# Altium schematic symbol library jlcpcb_2025_04_inductors_extended_0603.schlib: 1269 symbols (part 3 of 7) (continued)
## LQG18HH82NJ00D
designator L?  Inductance: 82nH
Inductor, 82nH, ±5%, 850mΩ, 300mA, SMD 0603; Manufacturer: Murata Electronics; Manufacturer Part Number: LQG18HH82NJ00D; Self-Resonant Frequency: 700MHz; Q Factor: 12@100MHz; Package Size: 0603; JLCPCB Basic Part: No; JLCPCB Part Number: C528976; Supplier 1: LCSC; Category: Inductors; Supplier Part Number 1: C528976; Tolerance: ±5%; Rated Current: 300mA; DC Resistance: 850mΩ; RoHS: Yes; ComponentLink1Description: Datasheet; ComponentLink1URL: https://wmsc.lcsc.com/wmsc/upload/file/pdf/v2/lcsc/2304140030_Murata-Electronics-LQG18HH82NJ00D_C528976.pdf; ComponentLink2Description: JLCPCB Part URL; ComponentLink2URL: https://jlcpcb.com/partdetail/C528976; ComponentLink3Description: LCSC Part URL; ComponentLink3URL: https://lcsc.com/product-detail/Inductors-SMD_Murata-Electronics-Murata-Electronics-LQG18HH82NJ00D_C528976.html
footprint IND-0603 (0603 (1608M) Inductor)
pins: 1, 2

## LQG18HHR15J00D
designator L?  Inductance: 150nH
Inductor, 150nH, ±5%, 1.2Ω, 300mA, SMD 0603; Manufacturer: Murata Electronics; Manufacturer Part Number: LQG18HHR15J00D; Self-Resonant Frequency: 550MHz; Q Factor: 14@250MHz; Package Size: 0603; JLCPCB Basic Part: No; JLCPCB Part Number: C471399; Supplier 1: LCSC; Category: Inductors; Supplier Part Number 1: C471399; Tolerance: ±5%; Rated Current: 300mA; DC Resistance: 1.2Ω; RoHS: Yes; ComponentLink1Description: Datasheet; ComponentLink1URL: https://wmsc.lcsc.com/wmsc/upload/file/pdf/v2/lcsc/2304140030_Murata-Electronics-LQG18HHR15J00D_C471399.pdf; ComponentLink2Description: JLCPCB Part URL; ComponentLink2URL: https://jlcpcb.com/partdetail/C471399; ComponentLink3Description: LCSC Part URL; ComponentLink3URL: https://lcsc.com/product-detail/Inductors-SMD_Murata-Electronics-Murata-Electronics-LQG18HHR15J00D_C471399.html
footprint IND-0603 (0603 (1608M) Inductor)
pins: 1, 2

## LQG18HHR18J00D
designator L?  Inductance: 180nH
Inductor, 180nH, ±5%, 1.3Ω, 300mA, SMD 0603; Manufacturer: Murata Electronics; Manufacturer Part Number: LQG18HHR18J00D; Self-Resonant Frequency: 500MHz; Q Factor: 14@100MHz; Package Size: 0603; JLCPCB Basic Part: No; JLCPCB Part Number: C1852012; Supplier 1: LCSC; Category: Inductors; Supplier Part Number 1: C1852012; Tolerance: ±5%; Rated Current: 300mA; DC Resistance: 1.3Ω; RoHS: Yes; ComponentLink1Description: Datasheet; ComponentLink1URL: https://wmsc.lcsc.com/wmsc/upload/file/pdf/v2/lcsc/2304140030_Murata-Electronics-LQG18HHR18J00D_C1852012.pdf; ComponentLink2Description: JLCPCB Part URL; ComponentLink2URL: https://jlcpcb.com/partdetail/C1852012; ComponentLink3Description: LCSC Part URL; ComponentLink3URL: https://lcsc.com/product-detail/Inductors-SMD_Murata-Electronics-Murata-Electronics-LQG18HHR18J00D_C1852012.html
footprint IND-0603 (0603 (1608M) Inductor)
pins: 1, 2

## LQG18HHR22J00D
designator L?  Inductance: 220nH
Inductor, 220nH, ±5%, 1.5Ω, 300mA, SMD 0603; Manufacturer: Murata Electronics; Manufacturer Part Number: LQG18HHR22J00D; Self-Resonant Frequency: 450MHz; Q Factor: 14@100MHz; Package Size: 0603; JLCPCB Basic Part: No; JLCPCB Part Number: C882497; Supplier 1: LCSC; Category: Inductors; Supplier Part Number 1: C882497; Tolerance: ±5%; Rated Current: 300mA; DC Resistance: 1.5Ω; RoHS: Yes; ComponentLink1Description: Datasheet; ComponentLink1URL: https://wmsc.lcsc.com/wmsc/upload/file/pdf/v2/lcsc/2201242130_Murata-Electronics-LQG18HHR22J00D_C882497.pdf; ComponentLink2Description: JLCPCB Part URL; ComponentLink2URL: https://jlcpcb.com/partdetail/C882497; ComponentLink3Description: LCSC Part URL; ComponentLink3URL: https://lcsc.com/product-detail/Inductors-SMD_Murata-Electronics-Murata-Electronics-LQG18HHR22J00D_C882497.html
footprint IND-0603 (0603 (1608M) Inductor)
pins: 1, 2

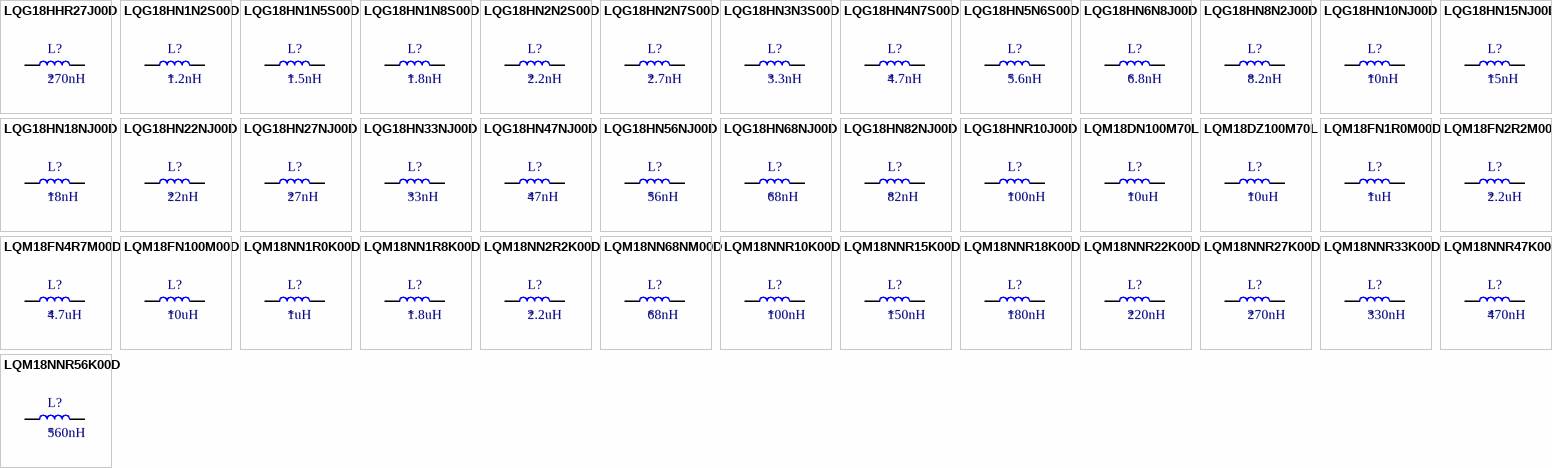
[diagram p12: symbols LQG18HHR27J00D to LQM18NNR56K00D]

## LQG18HHR27J00D
designator L?  Inductance: 270nH
Inductor, 270nH, ±5%, 1.9Ω, 200mA, SMD 0603; Manufacturer: Murata Electronics; Manufacturer Part Number: LQG18HHR27J00D; Self-Resonant Frequency: 100MHz; Q Factor: 14@100MHz; Package Size: 0603; JLCPCB Basic Part: No; JLCPCB Part Number: C471400; Supplier 1: LCSC; Category: Inductors; Supplier Part Number 1: C471400; Tolerance: ±5%; Rated Current: 200mA; DC Resistance: 1.9Ω; RoHS: Yes; ComponentLink1Description: Datasheet; ComponentLink1URL: https://wmsc.lcsc.com/wmsc/upload/file/pdf/v2/lcsc/2304140030_Murata-Electronics-LQG18HHR27J00D_C471400.pdf; ComponentLink2Description: JLCPCB Part URL; ComponentLink2URL: https://jlcpcb.com/partdetail/C471400; ComponentLink3Description: LCSC Part URL; ComponentLink3URL: https://lcsc.com/product-detail/Inductors-SMD_Murata-Electronics-Murata-Electronics-LQG18HHR27J00D_C471400.html
footprint IND-0603 (0603 (1608M) Inductor)
pins: 1, 2

## LQG18HN1N2S00D
designator L?  Inductance: 1.2nH
Inductor, 1.2nH, 100mΩ, 1.1A, SMD 0603; Manufacturer: Murata Electronics; Manufacturer Part Number: LQG18HN1N2S00D; Self-Resonant Frequency: 6GHz; Q Factor: 12@100MHz; Package Size: 0603; JLCPCB Basic Part: No; JLCPCB Part Number: C882496; Supplier 1: LCSC; Category: Inductors; Supplier Part Number 1: C882496; Rated Current: 1.1A; DC Resistance: 100mΩ; RoHS: Yes; ComponentLink1Description: Datasheet; ComponentLink1URL: https://wmsc.lcsc.com/wmsc/upload/file/pdf/v2/lcsc/2212191030_Murata-Electronics-LQG18HN1N2S00D_C882496.pdf; ComponentLink2Description: JLCPCB Part URL; ComponentLink2URL: https://jlcpcb.com/partdetail/C882496; ComponentLink3Description: LCSC Part URL; ComponentLink3URL: https://lcsc.com/product-detail/Inductors-SMD_Murata-Electronics-Murata-Electronics-LQG18HN1N2S00D_C882496.html
footprint IND-0603 (0603 (1608M) Inductor)
pins: 1, 2

## LQG18HN1N5S00D
designator L?  Inductance: 1.5nH
Inductor, 1.5nH, 100mΩ, 1.1A, SMD 0603; Manufacturer: Murata Electronics; Manufacturer Part Number: LQG18HN1N5S00D; Self-Resonant Frequency: 6GHz; Q Factor: 12@100MHz; Package Size: 0603; JLCPCB Basic Part: No; JLCPCB Part Number: C882495; Supplier 1: LCSC; Category: Inductors; Supplier Part Number 1: C882495; Rated Current: 1.1A; DC Resistance: 100mΩ; RoHS: Yes; ComponentLink1Description: Datasheet; ComponentLink1URL: https://wmsc.lcsc.com/wmsc/upload/file/pdf/v2/lcsc/2201242130_Murata-Electronics-LQG18HN1N5S00D_C882495.pdf; ComponentLink2Description: JLCPCB Part URL; ComponentLink2URL: https://jlcpcb.com/partdetail/C882495; ComponentLink3Description: LCSC Part URL; ComponentLink3URL: https://lcsc.com/product-detail/Inductors-SMD_Murata-Electronics-Murata-Electronics-LQG18HN1N5S00D_C882495.html
footprint IND-0603 (0603 (1608M) Inductor)
pins: 1, 2

## LQG18HN1N8S00D
designator L?  Inductance: 1.8nH
Inductor, 1.8nH, 100mΩ, 1.1A, SMD 0603; Manufacturer: Murata Electronics; Manufacturer Part Number: LQG18HN1N8S00D; Self-Resonant Frequency: 6GHz; Q Factor: 12@100MHz; Package Size: 0603; JLCPCB Basic Part: No; JLCPCB Part Number: C341764; Supplier 1: LCSC; Category: Inductors; Supplier Part Number 1: C341764; Rated Current: 1.1A; DC Resistance: 100mΩ; RoHS: Yes; ComponentLink1Description: Datasheet; ComponentLink1URL: https://wmsc.lcsc.com/wmsc/upload/file/pdf/v2/lcsc/2105241210_Murata-Electronics-LQG18HN1N8S00D_C341764.pdf; ComponentLink2Description: JLCPCB Part URL; ComponentLink2URL: https://jlcpcb.com/partdetail/C341764; ComponentLink3Description: LCSC Part URL; ComponentLink3URL: https://lcsc.com/product-detail/Inductors-SMD_Murata-Electronics-Murata-Electronics-LQG18HN1N8S00D_C341764.html
footprint IND-0603 (0603 (1608M) Inductor)
pins: 1, 2

## LQG18HN2N2S00D
designator L?  Inductance: 2.2nH
Inductor, 2.2nH, 100mΩ, 1.1A, SMD 0603; Manufacturer: Murata Electronics; Manufacturer Part Number: LQG18HN2N2S00D; Self-Resonant Frequency: 6GHz; Q Factor: 12@250MHz; Package Size: 0603; JLCPCB Basic Part: No; JLCPCB Part Number: C113061; Supplier 1: LCSC; Category: Inductors; Supplier Part Number 1: C113061; Rated Current: 1.1A; DC Resistance: 100mΩ; RoHS: Yes; ComponentLink1Description: Datasheet; ComponentLink1URL: https://wmsc.lcsc.com/wmsc/upload/file/pdf/v2/lcsc/1810311140_Murata-Electronics-LQG18HN2N2S00D_C113061.pdf; ComponentLink2Description: JLCPCB Part URL; ComponentLink2URL: https://jlcpcb.com/partdetail/C113061; ComponentLink3Description: LCSC Part URL; ComponentLink3URL: https://lcsc.com/product-detail/Inductors-SMD_Murata-Electronics-Murata-Electronics-LQG18HN2N2S00D_C113061.html
footprint IND-0603 (0603 (1608M) Inductor)
pins: 1, 2

## LQG18HN2N7S00D
designator L?  Inductance: 2.7nH
Inductor, 2.7nH, 120mΩ, 500mA, SMD 0603; Manufacturer: Murata Electronics; Manufacturer Part Number: LQG18HN2N7S00D; Self-Resonant Frequency: 6GHz; Q Factor: 12@100MHz; Package Size: 0603; JLCPCB Basic Part: No; JLCPCB Part Number: C162551; Supplier 1: LCSC; Category: Inductors; Supplier Part Number 1: C162551; Rated Current: 500mA; DC Resistance: 120mΩ; RoHS: Yes; ComponentLink1Description: Datasheet; ComponentLink1URL: https://wmsc.lcsc.com/wmsc/upload/file/pdf/v2/lcsc/2304140030_Murata-Electronics-LQG18HN2N7S00D_C162551.pdf; ComponentLink2Description: JLCPCB Part URL; ComponentLink2URL: https://jlcpcb.com/partdetail/C162551; ComponentLink3Description: LCSC Part URL; ComponentLink3URL: https://lcsc.com/product-detail/Inductors-SMD_Murata-Electronics-Murata-Electronics-LQG18HN2N7S00D_C162551.html
footprint IND-0603 (0603 (1608M) Inductor)
pins: 1, 2

## LQG18HN3N3S00D
designator L?  Inductance: 3.3nH
Inductor, 3.3nH, 120mΩ, 1A, SMD 0603; Manufacturer: Murata Electronics; Manufacturer Part Number: LQG18HN3N3S00D; Self-Resonant Frequency: 6GHz; Q Factor: 12@100MHz; Package Size: 0603; JLCPCB Basic Part: No; JLCPCB Part Number: C162552; Supplier 1: LCSC; Category: Inductors; Supplier Part Number 1: C162552; Rated Current: 1A; DC Resistance: 120mΩ; RoHS: Yes; ComponentLink1Description: Datasheet; ComponentLink1URL: https://wmsc.lcsc.com/wmsc/upload/file/pdf/v2/lcsc/2304140030_Murata-Electronics-LQG18HN3N3S00D_C162552.pdf; ComponentLink2Description: JLCPCB Part URL; ComponentLink2URL: https://jlcpcb.com/partdetail/C162552; ComponentLink3Description: LCSC Part URL; ComponentLink3URL: https://lcsc.com/product-detail/Inductors-SMD_Murata-Electronics-Murata-Electronics-LQG18HN3N3S00D_C162552.html
footprint IND-0603 (0603 (1608M) Inductor)
pins: 1, 2

## LQG18HN4N7S00D
designator L?  Inductance: 4.7nH
Inductor, 4.7nH, 150mΩ, 900mA, SMD 0603; Manufacturer: Murata Electronics; Manufacturer Part Number: LQG18HN4N7S00D; Self-Resonant Frequency: 6GHz; Q Factor: 12@100MHz; Package Size: 0603; JLCPCB Basic Part: No; JLCPCB Part Number: C882494; Supplier 1: LCSC; Category: Inductors; Supplier Part Number 1: C882494; Rated Current: 900mA; DC Resistance: 150mΩ; RoHS: Yes; ComponentLink1Description: Datasheet; ComponentLink1URL: https://wmsc.lcsc.com/wmsc/upload/file/pdf/v2/lcsc/2201242130_Murata-Electronics-LQG18HN4N7S00D_C882494.pdf; ComponentLink2Description: JLCPCB Part URL; ComponentLink2URL: https://jlcpcb.com/partdetail/C882494; ComponentLink3Description: LCSC Part URL; ComponentLink3URL: https://lcsc.com/product-detail/Inductors-SMD_Murata-Electronics-Murata-Electronics-LQG18HN4N7S00D_C882494.html
footprint IND-0603 (0603 (1608M) Inductor)
pins: 1, 2

## LQG18HN5N6S00D
designator L?  Inductance: 5.6nH
Inductor, 5.6nH, 200mΩ, 800mA, SMD 0603; Manufacturer: Murata Electronics; Manufacturer Part Number: LQG18HN5N6S00D; Self-Resonant Frequency: 5GHz; Q Factor: 12@100MHz; Package Size: 0603; JLCPCB Basic Part: No; JLCPCB Part Number: C441735; Supplier 1: LCSC; Category: Inductors; Supplier Part Number 1: C441735; Rated Current: 800mA; DC Resistance: 200mΩ; RoHS: Yes; ComponentLink1Description: Datasheet; ComponentLink1URL: https://wmsc.lcsc.com/wmsc/upload/file/pdf/v2/lcsc/2001062032_Murata-Electronics-LQG18HN5N6S00D_C441735.pdf; ComponentLink2Description: JLCPCB Part URL; ComponentLink2URL: https://jlcpcb.com/partdetail/C441735; ComponentLink3Description: LCSC Part URL; ComponentLink3URL: https://lcsc.com/product-detail/Inductors-SMD_Murata-Electronics-Murata-Electronics-LQG18HN5N6S00D_C441735.html
footprint IND-0603 (0603 (1608M) Inductor)
pins: 1, 2

## LQG18HN6N8J00D
designator L?  Inductance: 6.8nH
Inductor, 6.8nH, ±5%, 200mΩ, 800mA, SMD 0603; Manufacturer: Murata Electronics; Manufacturer Part Number: LQG18HN6N8J00D; Self-Resonant Frequency: 5GHz; Q Factor: 12@100MHz; Package Size: 0603; JLCPCB Basic Part: No; JLCPCB Part Number: C882493; Supplier 1: LCSC; Category: Inductors; Supplier Part Number 1: C882493; Tolerance: ±5%; Rated Current: 800mA; DC Resistance: 200mΩ; RoHS: Yes; ComponentLink1Description: Datasheet; ComponentLink1URL: https://wmsc.lcsc.com/wmsc/upload/file/pdf/v2/lcsc/2201242130_Murata-Electronics-LQG18HN6N8J00D_C882493.pdf; ComponentLink2Description: JLCPCB Part URL; ComponentLink2URL: https://jlcpcb.com/partdetail/C882493; ComponentLink3Description: LCSC Part URL; ComponentLink3URL: https://lcsc.com/product-detail/Inductors-SMD_Murata-Electronics-Murata-Electronics-LQG18HN6N8J00D_C882493.html
footprint IND-0603 (0603 (1608M) Inductor)
pins: 1, 2

## LQG18HN8N2J00D
designator L?  Inductance: 8.2nH
Inductor, 8.2nH, ±5%, 200mΩ, 400mA, SMD 0603; Manufacturer: Murata Electronics; Manufacturer Part Number: LQG18HN8N2J00D; Self-Resonant Frequency: 4GHz; Q Factor: 12@100MHz; Package Size: 0603; JLCPCB Basic Part: No; JLCPCB Part Number: C98009; Supplier 1: LCSC; Category: Inductors; Supplier Part Number 1: C98009; Tolerance: ±5%; Rated Current: 400mA; DC Resistance: 200mΩ; RoHS: Yes; ComponentLink1Description: Datasheet; ComponentLink1URL: https://wmsc.lcsc.com/wmsc/upload/file/pdf/v2/lcsc/1811031411_Murata-Electronics-LQG18HN8N2J00D_C98009.pdf; ComponentLink2Description: JLCPCB Part URL; ComponentLink2URL: https://jlcpcb.com/partdetail/C98009; ComponentLink3Description: LCSC Part URL; ComponentLink3URL: https://lcsc.com/product-detail/Inductors-SMD_Murata-Electronics-Murata-Electronics-LQG18HN8N2J00D_C98009.html
footprint IND-0603 (0603 (1608M) Inductor)
pins: 1, 2

## LQG18HN10NJ00D
designator L?  Inductance: 10nH
Inductor, 10nH, ±5%, 300mΩ, 400mA, SMD 0603; Manufacturer: Murata Electronics; Manufacturer Part Number: LQG18HN10NJ00D; Self-Resonant Frequency: 3.5GHz; Q Factor: 12@100MHz; Package Size: 0603; JLCPCB Basic Part: No; JLCPCB Part Number: C98005; Supplier 1: LCSC; Category: Inductors; Supplier Part Number 1: C98005; Tolerance: ±5%; Rated Current: 400mA; DC Resistance: 300mΩ; RoHS: Yes; ComponentLink1Description: Datasheet; ComponentLink1URL: https://wmsc.lcsc.com/wmsc/upload/file/pdf/v2/lcsc/1810311113_Murata-Electronics-LQG18HN10NJ00D_C98005.pdf; ComponentLink2Description: JLCPCB Part URL; ComponentLink2URL: https://jlcpcb.com/partdetail/C98005; ComponentLink3Description: LCSC Part URL; ComponentLink3URL: https://lcsc.com/product-detail/Inductors-SMD_Murata-Electronics-Murata-Electronics-LQG18HN10NJ00D_C98005.html
footprint IND-0603 (0603 (1608M) Inductor)
pins: 1, 2

## LQG18HN15NJ00D
designator L?  Inductance: 15nH
Inductor, 15nH, ±5%, 350mΩ, 350mA, SMD 0603; Manufacturer: Murata Electronics; Manufacturer Part Number: LQG18HN15NJ00D; Self-Resonant Frequency: 2.8GHz; Q Factor: 12@100MHz; Package Size: 0603; JLCPCB Basic Part: No; JLCPCB Part Number: C98006; Supplier 1: LCSC; Category: Inductors; Supplier Part Number 1: C98006; Tolerance: ±5%; Rated Current: 350mA; DC Resistance: 350mΩ; RoHS: Yes; ComponentLink1Description: Datasheet; ComponentLink1URL: https://wmsc.lcsc.com/wmsc/upload/file/pdf/v2/lcsc/1811132212_Murata-Electronics-LQG18HN15NJ00D_C98006.pdf; ComponentLink2Description: JLCPCB Part URL; ComponentLink2URL: https://jlcpcb.com/partdetail/C98006; ComponentLink3Description: LCSC Part URL; ComponentLink3URL: https://lcsc.com/product-detail/Inductors-SMD_Murata-Electronics-Murata-Electronics-LQG18HN15NJ00D_C98006.html
footprint IND-0603 (0603 (1608M) Inductor)
pins: 1, 2

## LQG18HN18NJ00D
designator L?  Inductance: 18nH
Inductor, 18nH, ±5%, 370mΩ, 600mA, SMD 0603; Manufacturer: Murata Electronics; Manufacturer Part Number: LQG18HN18NJ00D; Self-Resonant Frequency: 2.6GHz; Q Factor: 12@250MHz; Package Size: 0603; JLCPCB Basic Part: No; JLCPCB Part Number: C98007; Supplier 1: LCSC; Category: Inductors; Supplier Part Number 1: C98007; Tolerance: ±5%; Rated Current: 600mA; DC Resistance: 370mΩ; RoHS: Yes; ComponentLink1Description: Datasheet; ComponentLink1URL: https://wmsc.lcsc.com/wmsc/upload/file/pdf/v2/lcsc/1810311135_Murata-Electronics-LQG18HN18NJ00D_C98007.pdf; ComponentLink2Description: JLCPCB Part URL; ComponentLink2URL: https://jlcpcb.com/partdetail/C98007; ComponentLink3Description: LCSC Part URL; ComponentLink3URL: https://lcsc.com/product-detail/Inductors-SMD_Murata-Electronics-Murata-Electronics-LQG18HN18NJ00D_C98007.html
footprint IND-0603 (0603 (1608M) Inductor)
pins: 1, 2

## LQG18HN22NJ00D
designator L?  Inductance: 22nH
Inductor, 22nH, ±5%, 500mΩ, 500mA, SMD 0603; Manufacturer: Murata Electronics; Manufacturer Part Number: LQG18HN22NJ00D; Self-Resonant Frequency: 2.3GHz; Q Factor: 12@100MHz; Package Size: 0603; JLCPCB Basic Part: No; JLCPCB Part Number: C71649; Supplier 1: LCSC; Category: Inductors; Supplier Part Number 1: C71649; Tolerance: ±5%; Rated Current: 500mA; DC Resistance: 500mΩ; RoHS: Yes; ComponentLink1Description: Datasheet; ComponentLink1URL: https://wmsc.lcsc.com/wmsc/upload/file/pdf/v2/lcsc/1810311122_Murata-Electronics-LQG18HN22NJ00D_C71649.pdf; ComponentLink2Description: JLCPCB Part URL; ComponentLink2URL: https://jlcpcb.com/partdetail/C71649; ComponentLink3Description: LCSC Part URL; ComponentLink3URL: https://lcsc.com/product-detail/Inductors-SMD_Murata-Electronics-Murata-Electronics-LQG18HN22NJ00D_C71649.html
footprint IND-0603 (0603 (1608M) Inductor)
pins: 1, 2

## LQG18HN27NJ00D
designator L?  Inductance: 27nH
Inductor, 27nH, ±5%, 540mΩ, 500mA, SMD 0603; Manufacturer: Murata Electronics; Manufacturer Part Number: LQG18HN27NJ00D; Self-Resonant Frequency: 2GHz; Q Factor: 12@100MHz; Package Size: 0603; JLCPCB Basic Part: No; JLCPCB Part Number: C162550; Supplier 1: LCSC; Category: Inductors; Supplier Part Number 1: C162550; Tolerance: ±5%; Rated Current: 500mA; DC Resistance: 540mΩ; RoHS: Yes; ComponentLink1Description: Datasheet; ComponentLink1URL: https://wmsc.lcsc.com/wmsc/upload/file/pdf/v2/lcsc/2304140030_Murata-Electronics-LQG18HN27NJ00D_C162550.pdf; ComponentLink2Description: JLCPCB Part URL; ComponentLink2URL: https://jlcpcb.com/partdetail/C162550; ComponentLink3Description: LCSC Part URL; ComponentLink3URL: https://lcsc.com/product-detail/Inductors-SMD_Murata-Electronics-Murata-Electronics-LQG18HN27NJ00D_C162550.html
footprint IND-0603 (0603 (1608M) Inductor)
pins: 1, 2

## LQG18HN33NJ00D
designator L?  Inductance: 33nH
Inductor, 33nH, ±5%, 540mΩ, 500mA, SMD 0603; Manufacturer: Murata Electronics; Manufacturer Part Number: LQG18HN33NJ00D; Self-Resonant Frequency: 1.7GHz; Q Factor: 12@100MHz; Package Size: 0603; JLCPCB Basic Part: No; JLCPCB Part Number: C86068; Supplier 1: LCSC; Category: Inductors; Supplier Part Number 1: C86068; Tolerance: ±5%; Rated Current: 500mA; DC Resistance: 540mΩ; RoHS: Yes; ComponentLink1Description: Datasheet; ComponentLink1URL: https://wmsc.lcsc.com/wmsc/upload/file/pdf/v2/lcsc/2304140030_Murata-Electronics-LQG18HN33NJ00D_C86068.pdf; ComponentLink2Description: JLCPCB Part URL; ComponentLink2URL: https://jlcpcb.com/partdetail/C86068; ComponentLink3Description: LCSC Part URL; ComponentLink3URL: https://lcsc.com/product-detail/Inductors-SMD_Murata-Electronics-Murata-Electronics-LQG18HN33NJ00D_C86068.html
footprint IND-0603 (0603 (1608M) Inductor)
pins: 1, 2

## LQG18HN47NJ00D
designator L?  Inductance: 47nH
Inductor, 47nH, ±5%, 700mΩ, 400mA, SMD 0603; Manufacturer: Murata Electronics; Manufacturer Part Number: LQG18HN47NJ00D; Self-Resonant Frequency: 1.2GHz; Q Factor: 12@100MHz; Package Size: 0603; JLCPCB Basic Part: No; JLCPCB Part Number: C162553; Supplier 1: LCSC; Category: Inductors; Supplier Part Number 1: C162553; Tolerance: ±5%; Rated Current: 400mA; DC Resistance: 700mΩ; RoHS: Yes; ComponentLink1Description: Datasheet; ComponentLink1URL: https://wmsc.lcsc.com/wmsc/upload/file/pdf/v2/lcsc/2304140030_Murata-Electronics-LQG18HN47NJ00D_C162553.pdf; ComponentLink2Description: JLCPCB Part URL; ComponentLink2URL: https://jlcpcb.com/partdetail/C162553; ComponentLink3Description: LCSC Part URL; ComponentLink3URL: https://lcsc.com/product-detail/Inductors-SMD_Murata-Electronics-Murata-Electronics-LQG18HN47NJ00D_C162553.html
footprint IND-0603 (0603 (1608M) Inductor)
pins: 1, 2

## LQG18HN56NJ00D
designator L?  Inductance: 56nH
Inductor, 56nH, ±5%, 750mΩ, 400mA, SMD 0603; Manufacturer: Murata Electronics; Manufacturer Part Number: LQG18HN56NJ00D; Self-Resonant Frequency: 1.1GHz; Q Factor: 12@250MHz; Package Size: 0603; JLCPCB Basic Part: No; JLCPCB Part Number: C162554; Supplier 1: LCSC; Category: Inductors; Supplier Part Number 1: C162554; Tolerance: ±5%; Rated Current: 400mA; DC Resistance: 750mΩ; RoHS: Yes; ComponentLink1Description: Datasheet; ComponentLink1URL: https://wmsc.lcsc.com/wmsc/upload/file/pdf/v2/lcsc/2304140030_Murata-Electronics-LQG18HN56NJ00D_C162554.pdf; ComponentLink2Description: JLCPCB Part URL; ComponentLink2URL: https://jlcpcb.com/partdetail/C162554; ComponentLink3Description: LCSC Part URL; ComponentLink3URL: https://lcsc.com/product-detail/Inductors-SMD_Murata-Electronics-Murata-Electronics-LQG18HN56NJ00D_C162554.html
footprint IND-0603 (0603 (1608M) Inductor)
pins: 1, 2

## LQG18HN68NJ00D
designator L?  Inductance: 68nH
Inductor, 68nH, ±5%, 800mΩ, 400mA, SMD 0603; Manufacturer: Murata Electronics; Manufacturer Part Number: LQG18HN68NJ00D; Self-Resonant Frequency: 1GHz; Q Factor: 12@100MHz; Package Size: 0603; JLCPCB Basic Part: No; JLCPCB Part Number: C162555; Supplier 1: LCSC; Category: Inductors; Supplier Part Number 1: C162555; Tolerance: ±5%; Rated Current: 400mA; DC Resistance: 800mΩ; RoHS: Yes; ComponentLink1Description: Datasheet; ComponentLink1URL: https://wmsc.lcsc.com/wmsc/upload/file/pdf/v2/lcsc/2304140030_Murata-Electronics-LQG18HN68NJ00D_C162555.pdf; ComponentLink2Description: JLCPCB Part URL; ComponentLink2URL: https://jlcpcb.com/partdetail/C162555; ComponentLink3Description: LCSC Part URL; ComponentLink3URL: https://lcsc.com/product-detail/Inductors-SMD_Murata-Electronics-Murata-Electronics-LQG18HN68NJ00D_C162555.html
footprint IND-0603 (0603 (1608M) Inductor)
pins: 1, 2

## LQG18HN82NJ00D
designator L?  Inductance: 82nH
Inductor, 82nH, ±5%, 850mΩ, 350mA, SMD 0603; Manufacturer: Murata Electronics; Manufacturer Part Number: LQG18HN82NJ00D; Self-Resonant Frequency: 900MHz; Q Factor: 12@100MHz; Package Size: 0603; JLCPCB Basic Part: No; JLCPCB Part Number: C98008; Supplier 1: LCSC; Category: Inductors; Supplier Part Number 1: C98008; Tolerance: ±5%; Rated Current: 350mA; DC Resistance: 850mΩ; RoHS: Yes; ComponentLink1Description: Datasheet; ComponentLink1URL: https://wmsc.lcsc.com/wmsc/upload/file/pdf/v2/lcsc/1810311140_Murata-Electronics-LQG18HN82NJ00D_C98008.pdf; ComponentLink2Description: JLCPCB Part URL; ComponentLink2URL: https://jlcpcb.com/partdetail/C98008; ComponentLink3Description: LCSC Part URL; ComponentLink3URL: https://lcsc.com/product-detail/Inductors-SMD_Murata-Electronics-Murata-Electronics-LQG18HN82NJ00D_C98008.html
footprint IND-0603 (0603 (1608M) Inductor)
pins: 1, 2

## LQG18HNR10J00D
designator L?  Inductance: 100nH
Inductor, 100nH, ±5%, 900mΩ, 350mA, SMD 0603; Manufacturer: Murata Electronics; Manufacturer Part Number: LQG18HNR10J00D; Self-Resonant Frequency: 800MHz; Q Factor: 12@100MHz; Package Size: 0603; JLCPCB Basic Part: No; JLCPCB Part Number: C98010; Supplier 1: LCSC; Category: Inductors; Supplier Part Number 1: C98010; Tolerance: ±5%; Rated Current: 350mA; DC Resistance: 900mΩ; RoHS: Yes; ComponentLink1Description: Datasheet; ComponentLink1URL: https://wmsc.lcsc.com/wmsc/upload/file/pdf/v2/lcsc/1810311123_Murata-Electronics-LQG18HNR10J00D_C98010.pdf; ComponentLink2Description: JLCPCB Part URL; ComponentLink2URL: https://jlcpcb.com/partdetail/C98010; ComponentLink3Description: LCSC Part URL; ComponentLink3URL: https://lcsc.com/product-detail/Inductors-SMD_Murata-Electronics-Murata-Electronics-LQG18HNR10J00D_C98010.html
footprint IND-0603 (0603 (1608M) Inductor)
pins: 1, 2

## LQM18DN100M70L
designator L?  Inductance: 10uH
Inductor, 10uH, ±20%, 1.365Ω, SMD 0603; Manufacturer: Murata Electronics; Manufacturer Part Number: LQM18DN100M70L; Saturation Current: 100mA; Self-Resonant Frequency: 32MHz; Package Size: 0603; JLCPCB Basic Part: No; JLCPCB Part Number: C713281; Supplier 1: LCSC; Category: Inductors; Supplier Part Number 1: C713281; Tolerance: ±20%; DC Resistance: 1.365Ω; RoHS: Yes; ComponentLink1Description: Datasheet; ComponentLink1URL: https://wmsc.lcsc.com/wmsc/upload/file/pdf/v2/lcsc/2304140030_Murata-Electronics-LQM18DN100M70L_C713281.pdf; ComponentLink2Description: JLCPCB Part URL; ComponentLink2URL: https://jlcpcb.com/partdetail/C713281; ComponentLink3Description: LCSC Part URL; ComponentLink3URL: https://lcsc.com/product-detail/Inductors-SMD_Murata-Electronics-Murata-Electronics-LQM18DN100M70L_C713281.html
footprint IND-0603 (0603 (1608M) Inductor)
pins: 1, 2

## LQM18DZ100M70L
designator L?  Inductance: 10uH
Inductor, 10uH, ±20%, 1.37Ω, SMD 0603; Manufacturer: Murata Electronics; Manufacturer Part Number: LQM18DZ100M70L; Saturation Current: 100mA; Self-Resonant Frequency: 32MHz; Package Size: 0603; JLCPCB Basic Part: No; JLCPCB Part Number: C3911082; Supplier 1: LCSC; Category: Inductors; Supplier Part Number 1: C3911082; Tolerance: ±20%; DC Resistance: 1.37Ω; RoHS: Yes; ComponentLink1Description: Datasheet; ComponentLink1URL: https://wmsc.lcsc.com/wmsc/upload/file/pdf/v2/lcsc/2401280110_Murata-Electronics-LQM18DZ100M70L_C3911082.pdf; ComponentLink2Description: JLCPCB Part URL; ComponentLink2URL: https://jlcpcb.com/partdetail/C3911082; ComponentLink3Description: LCSC Part URL; ComponentLink3URL: https://lcsc.com/product-detail/Inductors-SMD_Murata-Electronics-Murata-Electronics-LQM18DZ100M70L_C3911082.html
footprint IND-0603 (0603 (1608M) Inductor)
pins: 1, 2

## LQM18FN1R0M00D
designator L?  Inductance: 1uH
Inductor, 1uH, ±20%, 260mΩ, 150mA, SMD 0603; Manufacturer: Murata Electronics; Manufacturer Part Number: LQM18FN1R0M00D; Self-Resonant Frequency: 1MHz; Package Size: 0603; JLCPCB Basic Part: No; JLCPCB Part Number: C113093; Supplier 1: LCSC; Category: Inductors; Supplier Part Number 1: C113093; Tolerance: ±20%; Rated Current: 150mA; Saturation Current: 150mA; DC Resistance: 260mΩ; RoHS: Yes; ComponentLink1Description: Datasheet; ComponentLink1URL: https://wmsc.lcsc.com/wmsc/upload/file/pdf/v2/lcsc/1810311113_Murata-Electronics-LQM18FN1R0M00D_C113093.pdf; ComponentLink2Description: JLCPCB Part URL; ComponentLink2URL: https://jlcpcb.com/partdetail/C113093; ComponentLink3Description: LCSC Part URL; ComponentLink3URL: https://lcsc.com/product-detail/Inductors-SMD_Murata-Electronics-Murata-Electronics-LQM18FN1R0M00D_C113093.html
footprint IND-0603 (0603 (1608M) Inductor)
pins: 1, 2

## LQM18FN2R2M00D
designator L?  Inductance: 2.2uH
Inductor, 2.2uH, ±20%, 400mΩ, 120mA, SMD 0603; Manufacturer: Murata Electronics; Manufacturer Part Number: LQM18FN2R2M00D; Self-Resonant Frequency: 80MHz; Package Size: 0603; JLCPCB Basic Part: No; JLCPCB Part Number: C324471; Supplier 1: LCSC; Category: Inductors; Supplier Part Number 1: C324471; Tolerance: ±20%; Rated Current: 120mA; Saturation Current: 120mA; DC Resistance: 400mΩ; RoHS: Yes; ComponentLink1Description: Datasheet; ComponentLink1URL: https://wmsc.lcsc.com/wmsc/upload/file/pdf/v2/lcsc/1912111437_Murata-Electronics-LQM18FN2R2M00D_C324471.pdf; ComponentLink2Description: JLCPCB Part URL; ComponentLink2URL: https://jlcpcb.com/partdetail/C324471; ComponentLink3Description: LCSC Part URL; ComponentLink3URL: https://lcsc.com/product-detail/Inductors-SMD_Murata-Electronics-Murata-Electronics-LQM18FN2R2M00D_C324471.html
footprint IND-0603 (0603 (1608M) Inductor)
pins: 1, 2

## LQM18FN4R7M00D
designator L?  Inductance: 4.7uH
Inductor, 4.7uH, ±20%, 780mΩ, 80mA, SMD 0603; Manufacturer: Murata Electronics; Manufacturer Part Number: LQM18FN4R7M00D; Self-Resonant Frequency: 1MHz; Package Size: 0603; JLCPCB Basic Part: No; JLCPCB Part Number: C98854; Supplier 1: LCSC; Category: Inductors; Supplier Part Number 1: C98854; Tolerance: ±20%; Rated Current: 80mA; Saturation Current: 80mA; DC Resistance: 780mΩ; RoHS: Yes; ComponentLink1Description: Datasheet; ComponentLink1URL: https://wmsc.lcsc.com/wmsc/upload/file/pdf/v2/lcsc/1810311117_Murata-Electronics-LQM18FN4R7M00D_C98854.pdf; ComponentLink2Description: JLCPCB Part URL; ComponentLink2URL: https://jlcpcb.com/partdetail/C98854; ComponentLink3Description: LCSC Part URL; ComponentLink3URL: https://lcsc.com/product-detail/Inductors-SMD_Murata-Electronics-Murata-Electronics-LQM18FN4R7M00D_C98854.html
footprint IND-0603 (0603 (1608M) Inductor)
pins: 1, 2

## LQM18FN100M00D
designator L?  Inductance: 10uH
Inductor, 10uH, ±20%, 1.17Ω, 50mA, SMD 0603; Manufacturer: Murata Electronics; Manufacturer Part Number: LQM18FN100M00D; Self-Resonant Frequency: 1MHz; Package Size: 0603; JLCPCB Basic Part: No; JLCPCB Part Number: C86083; Supplier 1: LCSC; Category: Inductors; Supplier Part Number 1: C86083; Tolerance: ±20%; Rated Current: 50mA; Saturation Current: 50mA; DC Resistance: 1.17Ω; RoHS: Yes; ComponentLink1Description: Datasheet; ComponentLink1URL: https://wmsc.lcsc.com/wmsc/upload/file/pdf/v2/lcsc/2304140030_Murata-Electronics-LQM18FN100M00D_C86083.pdf; ComponentLink2Description: JLCPCB Part URL; ComponentLink2URL: https://jlcpcb.com/partdetail/C86083; ComponentLink3Description: LCSC Part URL; ComponentLink3URL: https://lcsc.com/product-detail/Inductors-SMD_Murata-Electronics-Murata-Electronics-LQM18FN100M00D_C86083.html
footprint IND-0603 (0603 (1608M) Inductor)
pins: 1, 2

## LQM18NN1R0K00D
designator L?  Inductance: 1uH
Inductor, 1uH, ±10%, 600mΩ, 25mA, SMD 0603; Manufacturer: Murata Electronics; Manufacturer Part Number: LQM18NN1R0K00D; Self-Resonant Frequency: 75MHz; Q Factor: 35@10MHz; Package Size: 0603; JLCPCB Basic Part: No; JLCPCB Part Number: C882490; Supplier 1: LCSC; Category: Inductors; Supplier Part Number 1: C882490; Tolerance: ±10%; Rated Current: 25mA; DC Resistance: 600mΩ; RoHS: Yes; ComponentLink1Description: Datasheet; ComponentLink1URL: https://wmsc.lcsc.com/wmsc/upload/file/pdf/v2/lcsc/2201242130_Murata-Electronics-LQM18NN1R0K00D_C882490.pdf; ComponentLink2Description: JLCPCB Part URL; ComponentLink2URL: https://jlcpcb.com/partdetail/C882490; ComponentLink3Description: LCSC Part URL; ComponentLink3URL: https://lcsc.com/product-detail/Inductors-SMD_Murata-Electronics-Murata-Electronics-LQM18NN1R0K00D_C882490.html
footprint IND-0603 (0603 (1608M) Inductor)
pins: 1, 2

## LQM18NN1R8K00D
designator L?  Inductance: 1.8uH
Inductor, 1.8uH, ±10%, 950mΩ, 25mA, SMD 0603; Manufacturer: Murata Electronics; Manufacturer Part Number: LQM18NN1R8K00D; Self-Resonant Frequency: 55MHz; Q Factor: 35@10MHz; Package Size: 0603; JLCPCB Basic Part: No; JLCPCB Part Number: C86084; Supplier 1: LCSC; Category: Inductors; Supplier Part Number 1: C86084; Tolerance: ±10%; Rated Current: 25mA; DC Resistance: 950mΩ; RoHS: Yes; ComponentLink1Description: Datasheet; ComponentLink1URL: https://wmsc.lcsc.com/wmsc/upload/file/pdf/v2/lcsc/2304140030_Murata-Electronics-LQM18NN1R8K00D_C86084.pdf; ComponentLink2Description: JLCPCB Part URL; ComponentLink2URL: https://jlcpcb.com/partdetail/C86084; ComponentLink3Description: LCSC Part URL; ComponentLink3URL: https://lcsc.com/product-detail/Inductors-SMD_Murata-Electronics-Murata-Electronics-LQM18NN1R8K00D_C86084.html
footprint IND-0603 (0603 (1608M) Inductor)
pins: 1, 2

## LQM18NN2R2K00D
designator L?  Inductance: 2.2uH
Inductor, 2.2uH, ±10%, 1.15Ω, 15mA, SMD 0603; Manufacturer: Murata Electronics; Manufacturer Part Number: LQM18NN2R2K00D; Self-Resonant Frequency: 50MHz; Q Factor: 35@10MHz; Package Size: 0603; JLCPCB Basic Part: No; JLCPCB Part Number: C337907; Supplier 1: LCSC; Category: Inductors; Supplier Part Number 1: C337907; Tolerance: ±10%; Rated Current: 15mA; DC Resistance: 1.15Ω; RoHS: Yes; ComponentLink1Description: Datasheet; ComponentLink1URL: https://wmsc.lcsc.com/wmsc/upload/file/pdf/v2/lcsc/2304140030_Murata-Electronics-LQM18NN2R2K00D_C337907.pdf; ComponentLink2Description: JLCPCB Part URL; ComponentLink2URL: https://jlcpcb.com/partdetail/C337907; ComponentLink3Description: LCSC Part URL; ComponentLink3URL: https://lcsc.com/product-detail/Inductors-SMD_Murata-Electronics-Murata-Electronics-LQM18NN2R2K00D_C337907.html
footprint IND-0603 (0603 (1608M) Inductor)
pins: 1, 2

## LQM18NN68NM00D
designator L?  Inductance: 68nH
Inductor, 68nH, ±20%, 300mΩ, 50mA, SMD 0603; Manufacturer: Murata Electronics; Manufacturer Part Number: LQM18NN68NM00D; Self-Resonant Frequency: 250MHz; Q Factor: 10@50MHz; Package Size: 0603; JLCPCB Basic Part: No; JLCPCB Part Number: C882488; Supplier 1: LCSC; Category: Inductors; Supplier Part Number 1: C882488; Tolerance: ±20%; Rated Current: 50mA; DC Resistance: 300mΩ; RoHS: Yes; ComponentLink1Description: Datasheet; ComponentLink1URL: https://wmsc.lcsc.com/wmsc/upload/file/pdf/v2/lcsc/2201242130_Murata-Electronics-LQM18NN68NM00D_C882488.pdf; ComponentLink2Description: JLCPCB Part URL; ComponentLink2URL: https://jlcpcb.com/partdetail/C882488; ComponentLink3Description: LCSC Part URL; ComponentLink3URL: https://lcsc.com/product-detail/Inductors-SMD_Murata-Electronics-Murata-Electronics-LQM18NN68NM00D_C882488.html
footprint IND-0603 (0603 (1608M) Inductor)
pins: 1, 2

## LQM18NNR10K00D
designator L?  Inductance: 100nH
Inductor, 100nH, ±10%, 500mΩ, 50mA, SMD 0603; Manufacturer: Murata Electronics; Manufacturer Part Number: LQM18NNR10K00D; Self-Resonant Frequency: 240MHz; Q Factor: 15@25MHz; Package Size: 0603; JLCPCB Basic Part: No; JLCPCB Part Number: C237413; Supplier 1: LCSC; Category: Inductors; Supplier Part Number 1: C237413; Tolerance: ±10%; Rated Current: 50mA; DC Resistance: 500mΩ; RoHS: Yes; ComponentLink1Description: Datasheet; ComponentLink1URL: https://wmsc.lcsc.com/wmsc/upload/file/pdf/v2/lcsc/2304140030_Murata-Electronics-LQM18NNR10K00D_C237413.pdf; ComponentLink2Description: JLCPCB Part URL; ComponentLink2URL: https://jlcpcb.com/partdetail/C237413; ComponentLink3Description: LCSC Part URL; ComponentLink3URL: https://lcsc.com/product-detail/Inductors-SMD_Murata-Electronics-Murata-Electronics-LQM18NNR10K00D_C237413.html
footprint IND-0603 (0603 (1608M) Inductor)
pins: 1, 2

## LQM18NNR15K00D
designator L?  Inductance: 150nH
Inductor, 150nH, ±10%, 600mΩ, 50mA, SMD 0603; Manufacturer: Murata Electronics; Manufacturer Part Number: LQM18NNR15K00D; Self-Resonant Frequency: 180MHz; Q Factor: 15@25MHz; Package Size: 0603; JLCPCB Basic Part: No; JLCPCB Part Number: C86085; Supplier 1: LCSC; Category: Inductors; Supplier Part Number 1: C86085; Tolerance: ±10%; Rated Current: 50mA; DC Resistance: 600mΩ; RoHS: Yes; ComponentLink1Description: Datasheet; ComponentLink1URL: https://wmsc.lcsc.com/wmsc/upload/file/pdf/v2/lcsc/2304140030_Murata-Electronics-LQM18NNR15K00D_C86085.pdf; ComponentLink2Description: JLCPCB Part URL; ComponentLink2URL: https://jlcpcb.com/partdetail/C86085; ComponentLink3Description: LCSC Part URL; ComponentLink3URL: https://lcsc.com/product-detail/Inductors-SMD_Murata-Electronics-Murata-Electronics-LQM18NNR15K00D_C86085.html
footprint IND-0603 (0603 (1608M) Inductor)
pins: 1, 2

## LQM18NNR18K00D
designator L?  Inductance: 180nH
Inductor, 180nH, ±10%, 600mΩ, 50mA, SMD 0603; Manufacturer: Murata Electronics; Manufacturer Part Number: LQM18NNR18K00D; Self-Resonant Frequency: 165MHz; Q Factor: 15@25MHz; Package Size: 0603; JLCPCB Basic Part: No; JLCPCB Part Number: C337908; Supplier 1: LCSC; Category: Inductors; Supplier Part Number 1: C337908; Tolerance: ±10%; Rated Current: 50mA; DC Resistance: 600mΩ; RoHS: Yes; ComponentLink1Description: Datasheet; ComponentLink1URL: https://wmsc.lcsc.com/wmsc/upload/file/pdf/v2/lcsc/2304140030_Murata-Electronics-LQM18NNR18K00D_C337908.pdf; ComponentLink2Description: JLCPCB Part URL; ComponentLink2URL: https://jlcpcb.com/partdetail/C337908; ComponentLink3Description: LCSC Part URL; ComponentLink3URL: https://lcsc.com/product-detail/Inductors-SMD_Murata-Electronics-Murata-Electronics-LQM18NNR18K00D_C337908.html
footprint IND-0603 (0603 (1608M) Inductor)
pins: 1, 2

## LQM18NNR22K00D
designator L?  Inductance: 220nH
Inductor, 220nH, ±10%, 800mΩ, 50mA, SMD 0603; Manufacturer: Murata Electronics; Manufacturer Part Number: LQM18NNR22K00D; Self-Resonant Frequency: 150MHz; Q Factor: 15@25MHz; Package Size: 0603; JLCPCB Basic Part: No; JLCPCB Part Number: C162578; Supplier 1: LCSC; Category: Inductors; Supplier Part Number 1: C162578; Tolerance: ±10%; Rated Current: 50mA; DC Resistance: 800mΩ; RoHS: Yes; ComponentLink1Description: Datasheet; ComponentLink1URL: https://wmsc.lcsc.com/wmsc/upload/file/pdf/v2/lcsc/2304140030_Murata-Electronics-LQM18NNR22K00D_C162578.pdf; ComponentLink2Description: JLCPCB Part URL; ComponentLink2URL: https://jlcpcb.com/partdetail/C162578; ComponentLink3Description: LCSC Part URL; ComponentLink3URL: https://lcsc.com/product-detail/Inductors-SMD_Murata-Electronics-Murata-Electronics-LQM18NNR22K00D_C162578.html
footprint IND-0603 (0603 (1608M) Inductor)
pins: 1, 2

## LQM18NNR27K00D
designator L?  Inductance: 270nH
Inductor, 270nH, ±10%, 800mΩ, 50mA, SMD 0603; Manufacturer: Murata Electronics; Manufacturer Part Number: LQM18NNR27K00D; Self-Resonant Frequency: 136MHz; Q Factor: 15@25MHz; Package Size: 0603; JLCPCB Basic Part: No; JLCPCB Part Number: C882487; Supplier 1: LCSC; Category: Inductors; Supplier Part Number 1: C882487; Tolerance: ±10%; Rated Current: 50mA; DC Resistance: 800mΩ; RoHS: Yes; ComponentLink1Description: Datasheet; ComponentLink1URL: https://wmsc.lcsc.com/wmsc/upload/file/pdf/v2/lcsc/2201242130_Murata-Electronics-LQM18NNR27K00D_C882487.pdf; ComponentLink2Description: JLCPCB Part URL; ComponentLink2URL: https://jlcpcb.com/partdetail/C882487; ComponentLink3Description: LCSC Part URL; ComponentLink3URL: https://lcsc.com/product-detail/Inductors-SMD_Murata-Electronics-Murata-Electronics-LQM18NNR27K00D_C882487.html
footprint IND-0603 (0603 (1608M) Inductor)
pins: 1, 2

## LQM18NNR33K00D
designator L?  Inductance: 330nH
Inductor, 330nH, ±10%, 850mΩ, 35mA, SMD 0603; Manufacturer: Murata Electronics; Manufacturer Part Number: LQM18NNR33K00D; Self-Resonant Frequency: 125MHz; Q Factor: 15@25MHz; Package Size: 0603; JLCPCB Basic Part: No; JLCPCB Part Number: C162579; Supplier 1: LCSC; Category: Inductors; Supplier Part Number 1: C162579; Tolerance: ±10%; Rated Current: 35mA; DC Resistance: 850mΩ; RoHS: Yes; ComponentLink1Description: Datasheet; ComponentLink1URL: https://wmsc.lcsc.com/wmsc/upload/file/pdf/v2/lcsc/2304140030_Murata-Electronics-LQM18NNR33K00D_C162579.pdf; ComponentLink2Description: JLCPCB Part URL; ComponentLink2URL: https://jlcpcb.com/partdetail/C162579; ComponentLink3Description: LCSC Part URL; ComponentLink3URL: https://lcsc.com/product-detail/Inductors-SMD_Murata-Electronics-Murata-Electronics-LQM18NNR33K00D_C162579.html
footprint IND-0603 (0603 (1608M) Inductor)
pins: 1, 2

## LQM18NNR47K00D
designator L?  Inductance: 470nH
Inductor, 470nH, ±10%, 1.35Ω, 35mA, SMD 0603; Manufacturer: Murata Electronics; Manufacturer Part Number: LQM18NNR47K00D; Self-Resonant Frequency: 105MHz; Q Factor: 15@796kHz; Package Size: 0603; JLCPCB Basic Part: No; JLCPCB Part Number: C307602; Supplier 1: LCSC; Category: Inductors; Supplier Part Number 1: C307602; Tolerance: ±10%; Rated Current: 35mA; DC Resistance: 1.35Ω; RoHS: Yes; ComponentLink1Description: Datasheet; ComponentLink1URL: https://wmsc.lcsc.com/wmsc/upload/file/pdf/v2/lcsc/2304140030_Murata-Electronics-LQM18NNR47K00D_C307602.pdf; ComponentLink2Description: JLCPCB Part URL; ComponentLink2URL: https://jlcpcb.com/partdetail/C307602; ComponentLink3Description: LCSC Part URL; ComponentLink3URL: https://lcsc.com/product-detail/Inductors-SMD_Murata-Electronics-Murata-Electronics-LQM18NNR47K00D_C307602.html
footprint IND-0603 (0603 (1608M) Inductor)
pins: 1, 2

## LQM18NNR56K00D
designator L?  Inductance: 560nH
Inductor, 560nH, ±10%, 1.55Ω, 35mA, SMD 0603; Manufacturer: Murata Electronics; Manufacturer Part Number: LQM18NNR56K00D; Self-Resonant Frequency: 95MHz; Q Factor: 15@796kHz; Package Size: 0603; JLCPCB Basic Part: No; JLCPCB Part Number: C98029; Supplier 1: LCSC; Category: Inductors; Supplier Part Number 1: C98029; Tolerance: ±10%; Rated Current: 35mA; DC Resistance: 1.55Ω; RoHS: Yes; ComponentLink1Description: Datasheet; ComponentLink1URL: https://wmsc.lcsc.com/wmsc/upload/file/pdf/v2/lcsc/1810311140_Murata-Electronics-LQM18NNR56K00D_C98029.pdf; ComponentLink2Description: JLCPCB Part URL; ComponentLink2URL: https://jlcpcb.com/partdetail/C98029; ComponentLink3Description: LCSC Part URL; ComponentLink3URL: https://lcsc.com/product-detail/Inductors-SMD_Murata-Electronics-Murata-Electronics-LQM18NNR56K00D_C98029.html
footprint IND-0603 (0603 (1608M) Inductor)
pins: 1, 2

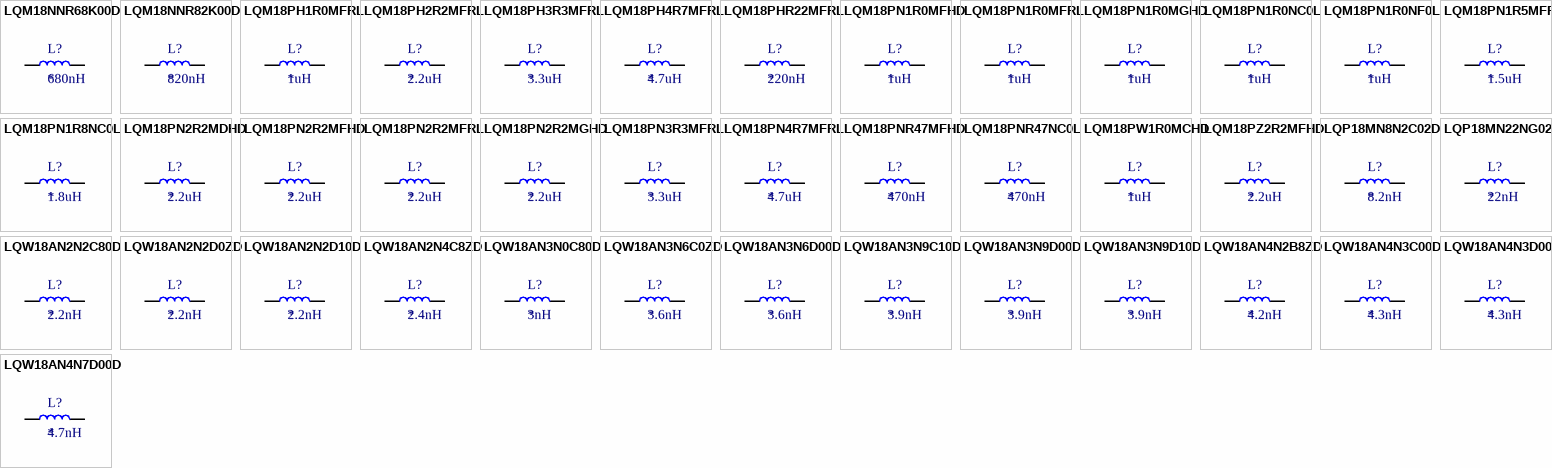
[diagram p13: symbols LQM18NNR68K00D to LQW18AN4N7D00D]
